# Altium schematic symbol library lib_datalogger.SchLib: 1246 symbols (part 4 of 16) (continued)
## CMP-004-000054-5 (continued)
footprint CC1005-0402 (Chip Capacitor; Body 0.039" L x 0.020" W (1.00mm x 0.50mm))
footprint CC2012-0805 (Chip Capacitor)
pins: 1, 2

## CMP-004-000055-2
designator C?, comment CAP CER 12pF 50V 5% NP0 0402 SMD  Package Quantity: 1  RoHS Compliant: Yes  Manufacturer: Samsung Electro-Mechanics  Case/Package: 0402  Packaging: Tape and Reel  Voltage Rating: 50V  Capacitance: 12pF  Max Operating Temperature: 125°C  Min Operating Temperature: -55°C  Tolerance: 5%
Ceramic capacitor SMD-0402 12pF /50V C0G# J +-5%, Samsung, RoHS; Part#: CL05C120JB5NNNC; eVendor: LCSC; Temperature Coefficient: 300ppm/°C; eVendor#: C26406; Dielectric: C0G; eVendorPrice: 0,0037; ComponentLink1Description: https://datasheet.ciiva.com/25806/cl05c120jb5nnnc-25806484.pdf?src-supplier=Digi-Key; Construction: Flat; Depth: 0.5mm; Material: Ceramic; ComponentLink3Description: https://datasheet.ciiva.com/29198/458703-da-01-en-vs-kondensator-0402-29198421.pdf?src-supplier=Conrad; Case Code (Metric): 1005; Length: 1mm; Series: CL; ComponentLink2Description: https://datasheet.ciiva.com/26838/getdatasheetpartid-658047-26838280.pdf?src-supplier=Verical; Source: mits.SchLib; Width: 0.02inch; Lead Free: Lead Free; Design Item ID: CAP CER 12pF 50V 5% NP0 0402 SMD; ComponentLink2URL: https://datasheet.ciiva.com/26838/getdatasheetpartid-658047-26838280.pdf?src-supplier=Verical; ComponentLink3URL: https://datasheet.ciiva.com/29198/458703-da-01-en-vs-kondensator-0402-29198421.pdf?src-supplier=Conrad; ComponentLink4URL: https://datasheet.ciiva.com/16449/cl05b104kq5nnnc-16449055.pdf?src-supplier=Future+Electronics; RoHS: Yes; Voltage Rating (DC): 50V; Contact Plating: Tin; ComponentLink1URL: https://datasheet.ciiva.com/25806/cl05c120jb5nnnc-25806484.pdf?src-supplier=Digi-Key; Stock 1: 135300; MOQ: 8690; Pricing 1: 100=0,00410, 1000=0,00310, 3000=0,00290, 10000=0,00270, 50000=0,00260, 100000=0,00260, 100=0,00390, 1000=0,00300, 3000=0,00280, 10000=0,00260, 50000=0,00250, 100000=0,00250, 100=0,02040, 1000=0,01580, 3000=0,01450, 10000=0,01380, 50000=0,01310, 100000=0,01310, 100=0,01960, 1000=0,01520, 3000=0,01390, 10000=0,01330, 50000=0,01260, 100000=0,01260, 100=0,00260, 1000=0,00200, 3000=0,00190, 10000=0,00180, 50000=0,00170, 100000=0,00170, 100=0,00230, 1000=0,00170, 3000=0,00160, 10000=0,00150, 50000=0,00150, 100000=0,00150, 100=0,02410, 1000=0,01870, 3000=0,01710, 10000=0,01630, 50000=0,01550, 100000=0,01550, 100=0,34060, 1000=0,26370, 3000=0,24170, 10000=0,23070, 50000=0,21970, 100000=0,21970, 100=0,01280, 1000=0,00990, 3000=0,00910, 10000=0,00870, 50000=0,00830, 100000=0,00830, 100=0,23450, 1000=0,18160, 3000=0,16640, 10000=0,15890, 50000=0,15130, 100000=0,15130, 100=0,02690, 1000=0,02080, 3000=0,01910, 10000=0,01820, 50000=0,01740, 100000=0,01740, 100=0,00420, 1000=0,00320, 3000=0,00300, 10000=0,00280, 50000=0,00270, 100000=0,00270, 100=0,00310, 1000=0,00240, 3000=0,00220, 10000=0,00210, 50000=0,00200, 100000=0,00200 (AUD); Category: Ceramic Capacitors; Case Code (Imperial): 0402; Thickness: 0.022inch; Manufacturer Part Number: CL05C120JB5NNNC; ComponentLink4Description: https://datasheet.ciiva.com/16449/cl05b104kq5nnnc-16449055.pdf?src-supplier=Future+Electronics; Radiation Hardening: No; Mount: Surface Mount; Voltage: 50V; Height: 0.5mm
footprint CC1005-0402 (Chip Capacitor; Body 0.039" L x 0.020" W (1.00mm x 0.50mm))
footprint CC1005-0402 (Chip Capacitor; Body 0.039" L x 0.020" W (1.00mm x 0.50mm))
pins: 1, 2

## CMP-004-000056-2
designator C?, comment CAP CER 18pF 50V 1% NP0 0402 SMD  Manufacturer: Murata Electronics North America
CAP CER 18PF 50V 1% NP0 0402; Part#: GRM1555C1H180FA01D; eVendorPrice: 0,10; MSRP: 0,011; eVendor: Digi-Key; eVendor#: 490-6203-1-ND; Source: mits.SchLib; Design Item ID: CAP CER 18pF 50V 1% NP0 0402 SMD; Datasheet: http://search.murata.co.jp/Ceramy/image/img/A01X/partnumbering_e_01.pdf; MOQ: 5000
footprint CC1005-0402 (Chip Capacitor; Body 0.039" L x 0.020" W (1.00mm x 0.50mm))
footprint CC1005-0402-3 (Chip Capacitor; Body 0.039" L x 0.020" W (1.00mm x 0.50mm))
pins: 1, 2

## CMP-004-000057-2
designator C?, comment CAP CER 1nF 250V 10% X7R 0603 SMD  Packaging: Tape and Reel  Case/Package: 0603  Tolerance: 10%  Min Operating Temperature: -55°C  Capacitance: 1nF  Max Operating Temperature: 125°C  RoHS Compliant: Yes  Voltage Rating: 250V
Cap Ceramic 0.001uF 250V X7R 10% Pad SMD 0603 125°C T/R; Manufacturer Part Number 1: CC0603KRX7RYBB102; Manufacturer 1: Yageo; Thickness: 0.035inch; Width: 0.031inch; ComponentLink1Description: https://datasheet.ciiva.com/16199/cl05b104kq5nnnc-16199064.pdf?src-supplier=Future+Electronics; Length: 0.063inch; Supplier Unit Price 1: *; ComponentLink1URL: https://datasheet.ciiva.com/16199/cl05b104kq5nnnc-16199064.pdf?src-supplier=Future+Electronics; Category: Ceramic Capacitors; Source: mits.SchLib; Design Item ID: CAP CER 1nF 250V 10% X7R 0603 SMD; Mount: Surface Mount
footprint CC1005-0402 (Chip Capacitor; Body 0.039" L x 0.020" W (1.00mm x 0.50mm))
footprint CC1608-0603 (Chip Capacitor; Body 1.6 x 0.8 mm (LxW typ))
pins: 1, 2

## CMP-004-000058-2
designator C?, comment CAP CER 1nF 50V 10% X7R 0603 SMD  Min Operating Temperature: -55°C  Capacitance: 1nF  Manufacturer: Samsung  Packaging: Tape and Reel  Tolerance: 10%  RoHS Compliant: Yes  Voltage Rating: 50V  Package Quantity: 1  Case/Package: 0603  Max Operating Temperature: 125°C
Cap Ceramic 0.001uF 50V X7R 10% Pad SMD 0603 125°C T/R; Manufacturer Part Number: CL10B102KB8NNNC; Case Code (Metric): 1608; Material: Ceramic; ComponentLink1URL: https://datasheet.ciiva.com/25805/cl10b102kb8nnnc-25805137.pdf?src-supplier=Digi-Key; Case Code (Imperial): 0603; Dielectric: X7R; ComponentLink1Description: https://datasheet.ciiva.com/25805/cl10b102kb8nnnc-25805137.pdf?src-supplier=Digi-Key; Voltage Rating (DC): 50V; Category: Ceramic Capacitors; Voltage: 50V; Depth: 0.8mm; Contact Plating: Tin; Source: mits.SchLib; ComponentLink2Description: https://datasheet.ciiva.com/15216/getdatasheetpartid-359690-15216231.pdf?src-supplier=Verical; Thickness: 0.035inch; ComponentLink4URL: https://datasheet.ciiva.com/26310/mlcc-catalogdownload2013-eng-26310326.pdf?src-supplier=Distrelec; ComponentLink4Description: https://datasheet.ciiva.com/26310/mlcc-catalogdownload2013-eng-26310326.pdf?src-supplier=Distrelec; Design Item ID: CAP CER 1nF 50V 10% X7R 0603 SMD; Length: 1.6mm; Construction: Flat; ComponentLink5Description: https://datasheet.ciiva.com/16199/cl05b104kq5nnnc-16199064.pdf?src-supplier=Future+Electronics; ComponentLink2URL: https://datasheet.ciiva.com/15216/getdatasheetpartid-359690-15216231.pdf?src-supplier=Verical; ComponentLink3URL: https://datasheet.ciiva.com/29198/458300-da-01-en-vs-kondensator-0603-29198498.pdf?src-supplier=Conrad; Series: CL; Pricing 1: 50=0,00710, 500=0,00540, 1500=0,00510, 5000=0,00470, 25000=0,00460, 50000=0,00460, 50=0,00680, 500=0,00520, 1500=0,00490, 5000=0,00450, 25000=0,00440, 50000=0,00440, 50=0,03550, 500=0,02690, 1500=0,02560, 5000=0,02370, 25000=0,02300, 50000=0,02300, 50=0,03410, 500=0,02590, 1500=0,02460, 5000=0,02270, 25000=0,02210, 50000=0,02210, 50=0,00460, 500=0,00350, 1500=0,00330, 5000=0,00310, 25000=0,00300, 50000=0,00300, 50=0,00390, 500=0,00300, 1500=0,00280, 5000=0,00260, 25000=0,00250, 50000=0,00250, 50=0,04200, 500=0,03190, 1500=0,03030, 5000=0,02800, 25000=0,02720, 50000=0,02720, 50=0,59330, 500=0,45040, 1500=0,42850, 5000=0,39550, 25000=0,38450, 50000=0,38450, 50=0,02240, 500=0,01700, 1500=0,01620, 5000=0,01490, 25000=0,01450, 50000=0,01450, 50=0,40850, 500=0,31020, 1500=0,29500, 5000=0,27230, 25000=0,26480, 50000=0,26480, 50=0,04690, 500=0,03560, 1500=0,03390, 5000=0,03130, 25000=0,03040, 50000=0,03040, 50=0,00730, 500=0,00550, 1500=0,00530, 5000=0,00490, 25000=0,00470, 50000=0,00470, 50=0,00540, 500=0,00410, 1500=0,00390, 5000=0,00360, 25000=0,00350, 50000=0,00350 (AUD); Height: 0.8mm; Mount: Surface Mount; ComponentLink5URL: https://datasheet.ciiva.com/16199/cl05b104kq5nnnc-16199064.pdf?src-supplier=Future+Electronics; RoHS: Yes; Radiation Hardening: No; Lead Free: Lead Free; Width: 0.031inch; ComponentLink3Description: https://datasheet.ciiva.com/29198/458300-da-01-en-vs-kondensator-0603-29198498.pdf?src-supplier=Conrad; Stock 1: 1234100
footprint CC1005-0402 (Chip Capacitor; Body 0.039" L x 0.020" W (1.00mm x 0.50mm))
footprint CC1608-0603 (Chip Capacitor; Body 1.6 x 0.8 mm (LxW typ))
pins: 1, 2

## CMP-004-000059-2
designator C?, comment CAP CER 1nF 50V 10% X7R 0805 SMD  Case/Package: 0805  Tolerance: 5%  Max Operating Temperature: 125°C  Min Operating Temperature: -55°C  Package Quantity: 1  Lead Pitch: 0.75mm  Packaging: Tape and Reel  Voltage Rating: 50V  Capacitance: 1nF  Manufacturer: KEMET
Cap Ceramic 0.001uF 50V C0G 5% SMD 0805 125C Paper T/R; Manufacturer Part Number: C0805C102J5GACTU; Dissipation Factor: 0.1%; Temperature Coefficient: 30ppm/°C; ComponentLink7URL: https://datasheet.ciiva.com/7842/1776094-7842155.pdf?src-supplier=Element14; ComponentLink2URL: https://datasheet.ciiva.com/5904/1776094-5904675.pdf?src-supplier=Farnell; Stock 1: 125276; ComponentLink9Description: https://datasheet.ciiva.com/14586/70095383-14586728.pdf?src-supplier=Allied+Electronics; Contact Material: Tin; Number of Pins: 2; ComponentLink10Description: https://datasheet.ciiva.com/7842/1776094-7842154.pdf?src-supplier=Element14; ComponentLink5Description: https://datasheet.ciiva.com/7842/f9080b-0402-series-c0g-7842521.pdf?src-supplier=Element14; REACH SVHC: No SVHC; Mount: Surface Mount,PCB; ComponentLink3URL: https://datasheet.ciiva.com/7172/1668701-7172393.pdf?src-supplier=Newark; Contact Plating: Tin,Matte; Lead Free: Lead Free; Termination: SMD/SMT; ComponentLink1URL: https://datasheet.ciiva.com/26923/getdatasheetpartid-772891-26923949.pdf?src-supplier=Verical; ComponentLink8URL: https://datasheet.ciiva.com/18193/getdatasheetpartid-293878-18193318.pdf?src-supplier=Verical; Dielectric: C0G; Length: 2mm; ComponentLink8Description: https://datasheet.ciiva.com/18193/getdatasheetpartid-293878-18193318.pdf?src-supplier=Verical; Design Item ID: CAP CER 1nF 50V 10% X7R 0805 SMD; ComponentLink6Description: https://datasheet.ciiva.com/28672/1789732-28672793.pdf?src-supplier=Element14; Pricing 1: 1=0,13000, 10=0,09500, 100=0,04460, 500=0,03126, 1000=0,02589 (USD); Thickness: 0.035inch; Source: mits.SchLib; ComponentLink1Description: https://datasheet.ciiva.com/26923/getdatasheetpartid-772891-26923949.pdf?src-supplier=Verical; ComponentLink7Description: https://datasheet.ciiva.com/7842/1776094-7842155.pdf?src-supplier=Element14; ComponentLink2Description: https://datasheet.ciiva.com/5904/1776094-5904675.pdf?src-supplier=Farnell; ComponentLink3Description: https://datasheet.ciiva.com/7172/1668701-7172393.pdf?src-supplier=Newark; Width: 1.2mm; Height: 0.78mm; Dielectric Material: Ceramic; RoHS: Yes; ComponentLink4URL: https://datasheet.ciiva.com/7842/kem-c1003-c0g-smd-7842520.pdf?src-supplier=Element14; Voltage: 50V; ComponentLink10URL: https://datasheet.ciiva.com/7842/1776094-7842154.pdf?src-supplier=Element14; Radiation Hardening: No; Case Code (Metric): 2012; Depth: 1.25mm; ComponentLink6URL: https://datasheet.ciiva.com/28672/1789732-28672793.pdf?src-supplier=Element14; Case Code (Imperial): 0805; ComponentLink4Description: https://datasheet.ciiva.com/7842/kem-c1003-c0g-smd-7842520.pdf?src-supplier=Element14; ComponentLink9URL: https://datasheet.ciiva.com/14586/70095383-14586728.pdf?src-supplier=Allied+Electronics; ComponentLink5URL: https://datasheet.ciiva.com/7842/f9080b-0402-series-c0g-7842521.pdf?src-supplier=Element14; Category: Tantalum Capacitors; Voltage Rating (DC): 50V
footprint CC1005-0402 (Chip Capacitor; Body 0.039" L x 0.020" W (1.00mm x 0.50mm))
footprint CC2012-0805 (Chip Capacitor)
pins: 1, 2

## CMP-004-000060-3
designator C?, comment CAP CER 1uF 100V 10% X7R 0805 SMD  Max Operating Temperature: 125°C  Capacitance: 1uF  Voltage Rating: 100V  Min Operating Temperature: -55°C  Case/Package: 0805  Package Quantity: 1  Tolerance: 10%  Packaging: Tape and Reel  Manufacturer: TDK
1 µF, 100 V, 0805 10%, X7S, CGA Series; Manufacturer Part Number: CGA4J3X7S2A105K125AB; Pricing 1: 1=0,46000, 10=0,32200, 100=0,21190, 500=0,15698, 1000=0,13343 (USD); Composition: Ceramic; Thickness: 0.057inch; ComponentLink2Description: https://datasheet.ciiva.com/17487/e413-cga-17487211.pdf?src-supplier=Avnet+Europe; Termination: SMD/SMT; Lead Free: Lead Free; Weight: 0.000194oz; REACH SVHC: No SVHC; Design Item ID: CAP CER 1uF 100V 10% X7R 0805 SMD; Source: mits.SchLib; Radiation Hardening: No; Depth: 1.25mm; Dielectric: X7S; ComponentLink1Description: https://datasheet.ciiva.com/24218/cga4j3x7s2a105k125ab-265950-24218289.pdf?src-supplier=Mouser; ComponentLink1URL: https://datasheet.ciiva.com/24218/cga4j3x7s2a105k125ab-265950-24218289.pdf?src-supplier=Mouser; Mount: Surface Mount; ComponentLink2URL: https://datasheet.ciiva.com/17487/e413-cga-17487211.pdf?src-supplier=Avnet+Europe; Voltage Rating (DC): 100V; Case Code (Imperial): 0805; Length: 2mm; Ratings: AEC-Q200; RoHS: Yes; Height: 1.25mm; Category: Ceramic Capacitors; Width: 0.049inch; Stock 1: 205859; Case Code (Metric): 2012
footprint CC1005-0402 (Chip Capacitor; Body 0.039" L x 0.020" W (1.00mm x 0.50mm))
footprint CC2012-0805 (Chip Capacitor)
pins: 1, 2

## CMP-004-000061-2
designator C?, comment CAP CER 1uF 16V 10% X7R 0603 SMD  Min Operating Temperature: -55°C  RoHS Compliant: Yes  Max Operating Temperature: 85°C  Tolerance: 10%  Case/Package: 0603  Manufacturer: Vishay  Capacitance: 1uF  Packaging: Tape and Reel
Cap Ceramic 1uF 16V X5R 10% SMD 0603 85C Paper T/R; Manufacturer Part Number: VJ0603G105KXJCW1BC; Dielectric Material: Tantalum; Voltage Rating (DC): 16V; ComponentLink1URL: http://components.arrow.com/part/dataview/0323_01411208?src-supplier=Arrow+Europe; Lead Free: Lead Free; Source: mits.SchLib; RoHS: Yes; Category: Ceramic Capacitors; Design Item ID: CAP CER 1uF 16V 10% X7R 0603 SMD; Length: 1.6mm; Stock 1: 116460; Pricing 1: 20=0,04640, 200=0,03600, 600=0,03410, 2000=0,03220, 10000=0,03140, 20000=0,03090, 20=0,04470, 200=0,03460, 600=0,03290, 2000=0,03100, 10000=0,03020, 20000=0,02970, 20=0,23320, 200=0,18070, 600=0,17150, 2000=0,16160, 10000=0,15770, 20000=0,15510, 20=0,22420, 200=0,17370, 600=0,16490, 2000=0,15540, 10000=0,15160, 20000=0,14910, 20=0,03020, 200=0,02340, 600=0,02220, 2000=0,02090, 10000=0,02040, 20000=0,02000, 20=0,02580, 200=0,02000, 600=0,01890, 2000=0,01790, 10000=0,01740, 20000=0,01710, 20=0,27600, 200=0,21380, 600=0,20290, 2000=0,19120, 10000=0,18660, 20000=0,18350, 20=3,90020, 200=3,02130, 600=2,86750, 2000=2,70270, 10000=2,63680, 20000=2,59280, 20=0,14710, 200=0,11400, 600=0,10820, 2000=0,10190, 10000=0,09950, 20000=0,09780, 20=2,68560, 200=2,08040, 600=1,97450, 2000=1,86100, 10000=1,81560, 20000=1,78540, 20=0,30830, 200=0,23880, 600=0,22670, 2000=0,21360, 10000=0,20840, 20000=0,20500, 20=0,04790, 200=0,03710, 600=0,03520, 2000=0,03320, 10000=0,03240, 20000=0,03180, 20=0,03550, 200=0,02750, 600=0,02610, 2000=0,02460, 10000=0,02400, 20000=0,02360 (AUD); Depth: 0.8mm; ComponentLink1Description: http://components.arrow.com/part/dataview/0323_01411208?src-supplier=Arrow+Europe; ComponentLink2URL: http://www.vishay.com/docs/28548/vjw1bcbascomseries.pdf?src-supplier=Digi-Key; Dielectric: X5R; ComponentLink2Description: http://www.vishay.com/docs/28548/vjw1bcbascomseries.pdf?src-supplier=Digi-Key
footprint CC1005-0402 (Chip Capacitor; Body 0.039" L x 0.020" W (1.00mm x 0.50mm))
footprint CC1608-0603 (Chip Capacitor; Body 1.6 x 0.8 mm (LxW typ))
pins: 1, 2

## CMP-004-000062-2
designator C?, comment CAP CER 1uF 50V 10% X7R 0603 SMD  Min Operating Temperature: -55°C  Max Operating Temperature: 85°C  Packaging: Tape and Reel  Tolerance: 10%  Package Quantity: 1  Manufacturer: Samsung  Capacitance: 1uF  Case/Package: 0603  Voltage Rating: 50V
Cap Ceramic 1uF 50V X5R 10% SMD 0603 85C Cardboard T/R; Manufacturer Part Number: CL10A105KB8NNNC; Construction: Flat; Series: CL; ComponentLink1URL: https://datasheet.ciiva.com/24218/cga4j3x7s2a105k125ab-265950-24218289.pdf?src-supplier=Mouser; ComponentLink2Description: https://datasheet.ciiva.com/17487/e413-cga-17487211.pdf?src-supplier=Avnet+Europe; Length: 1.6mm; Mount: Surface Mount; Width: 0.031inch; RoHS: Yes; Thickness: 0.035inch; Pricing 2: 4000=0,01908, 8000=0,01906, 16000=0,05086, 24000=0,01901, 32000=0,01899, 40000=0,05066, 400000=0,01893 (USD); ComponentLink3URL: https://datasheet.ciiva.com/26877/getdatasheetpartid-753736-26877879.pdf?src-supplier=Verical; Source: mits.SchLib; Category: Ceramic Capacitors; ComponentLink3Description: https://datasheet.ciiva.com/26877/getdatasheetpartid-753736-26877879.pdf?src-supplier=Verical; Depth: 0.8mm; Dielectric: X5R; ComponentLink1Description: https://datasheet.ciiva.com/24218/cga4j3x7s2a105k125ab-265950-24218289.pdf?src-supplier=Mouser; Case Code (Imperial): 0603; Termination: Wraparound; Radiation Hardening: No; Contact Plating: Tin; Case Code (Metric): 1608; ComponentLink2URL: https://datasheet.ciiva.com/17487/e413-cga-17487211.pdf?src-supplier=Avnet+Europe; Design Item ID: CAP CER 1uF 50V 10% X7R 0603 SMD
footprint CC1005-0402 (Chip Capacitor; Body 0.039" L x 0.020" W (1.00mm x 0.50mm))
footprint CC1608-0603 (Chip Capacitor; Body 1.6 x 0.8 mm (LxW typ))
pins: 1, 2

## CMP-004-000063-3
designator C?, comment CAP CER 2.2nF 50V 5% X7R 0603 SMD  Capacitance: 2.2nF  Manufacturer: Kemet  RoHS Compliant: Yes  Tolerance: 5%  Min Operating Temperature: -55°C  Packaging: Tape and Reel  Package Quantity: 1  Max Operating Temperature: 125°C  Lead Pitch: 0.7mm  Case/Package: 0603  Voltage Rating: 50V
CAP CER 2200PF 50V 5% X7R 0603; Part#: C0603C222J5RACTU; eVendor: Digi-Key; eVendor#: 399-7879-1-ND; eVendorPrice: 0,10; Dissipation Factor: 2.5%; MSRP: 0,0099; Dielectric Material: Ceramic; Design Item ID: CAP CER 2.2nF 50V 5% X7R 0603 SMD; Radiation Hardening: No; Voltage Rating (DC): 50V; Case Code (Imperial): 0603; Construction: Flat; Datasheet: http://www.kemet.com/datasheets&C0603C222J5RACTU; Series: C; Voltage: 50V; Width: 0.031inch; Depth: 0.8mm; MOQ: 1000; Termination: SMD/SMT; REACH SVHC: No SVHC; Number of Pins: 2; Source: mits.SchLib; Dielectric: X7R; Mount: Surface Mount,PCB; Thickness: 0.034inch; Case Code (Metric): 1608; Height: 0.8mm; Length: 1.6mm
footprint CC1005-0402 (Chip Capacitor; Body 0.039" L x 0.020" W (1.00mm x 0.50mm))
footprint CC1608-0603 (Chip Capacitor; Body 1.6 x 0.8 mm (LxW typ))
pins: 1, 2

## CMP-004-000064-2
designator C?, comment CAP CER 2.2uF 100V X7R 1210 SMD  Packaging: Cut Tape (CT)  Manufacturer: Murata Electronics North America  Tolerance: ±10%  Capacitance: 2.2µF
CAP CER 2.2UF 100V X7R 1210; Manufacturer Part Number: GRM32ER72A225KA35L; Features: -; Category: Capacitors; Package / Case: 1210 (3225 Metric); Mounting Type: Surface Mount, MLCC; Lead Style: -; ComponentLink1URL: http://www.murata.com/~/media/webrenewal/support/library/catalog/products/capacitor/mlcc/c02e.pdf; Ratings: -; Lead Spacing: -; Source: mits.SchLib; ComponentLink1Description: http://www.murata.com/~/media/webrenewal/support/library/catalog/products/capacitor/mlcc/c02e.pdf; Voltage - Rated: 100V; Size / Dimension: 0.126" L x 0.098" W (3.20mm x 2.50mm); Stock 1: 228481; Operating Temperature: -55°C ~ 125°C; Pricing 1: 1=0.7, 10=0.67, 50=0.4, 100=0.325, 250=0.27, 500=0.245 (USD); Thickness (Max): 0.106" (2.70mm); Height - Seated (Max): -; Design Item ID: CAP CER 2.2uF 100V X7R 1210 SMD; Temperature Coefficient: X7R; Applications: General Purpose; RoHS: RoHS Compliant
footprint CC1005-0402 (Chip Capacitor; Body 0.039" L x 0.020" W (1.00mm x 0.50mm))
footprint CC3225-1210 (Chip Capacitor; Body 1.6 x 0.8 mm (LxW typ))
pins: 1, 2

## CMP-004-000065-2
designator C?, comment CAP CER 2.2uF 50V 10% X5R 0805 SMD  Voltage Rating: 50V  RoHS Compliant: Yes  Package Quantity: 1  Capacitance: 2.2uF  Manufacturer: Samsung  Packaging: Tape and Reel  Tolerance: 10%  Min Operating Temperature: -55°C  Max Operating Temperature: 85°C  Case/Package: 0805
CAP CER 2.2UF 50V X5R 0805; Manufacturer Part Number: CL21A225KB9LNNC; Stock 1: 10649; Dielectric: X5R; Width: 0.049inch; Lead Free: Lead Free; Case Code (Imperial): 0805; Category: Ceramic Capacitors; Case Code (Metric): 2012; Depth: 1.25mm; ComponentLink1Description: https://datasheet.ciiva.com/25796/cl21a225kb9lnnc-25796770.pdf?src-supplier=Digi-Key; Length: 0.079inch; Mount: Surface Mount; RoHS: Yes; Series: CL; Pricing 1: 1=0,31000, 10=0,21400, 50=0,14240, 100=0,12100, 500=0,08542, 1000=0,07474 (USD); Design Item ID: CAP CER 2.2uF 50V 10% X5R 0805 SMD; Source: mits.SchLib; ComponentLink1URL: https://datasheet.ciiva.com/25796/cl21a225kb9lnnc-25796770.pdf?src-supplier=Digi-Key; Thickness: 0.039inch
footprint CC1005-0402 (Chip Capacitor; Body 0.039" L x 0.020" W (1.00mm x 0.50mm))
footprint CC2012-0805 (Chip Capacitor)
pins: 1, 2

## CMP-004-000066-2
designator C?, comment CAP CER 22nF 50V C0G 1206 SMD_1  Manufacturer: TDK Corporation  Packaging: Cut Tape (CT)  Capacitance: 0.022µF  Tolerance: ±5%
CAP CER 0.022UF 50V C0G 1206; Manufacturer Part Number: C3216C0G1H223J060AA; Temperature Coefficient: C0G, NP0; ComponentLink1URL: https://product.tdk.com/info/en/catalog/datasheets/mlcc_commercial_general_en.pdf; Applications: General Purpose; Lead Style: -; Operating Temperature: -55°C ~ 125°C; Size / Dimension: 0.126" L x 0.063" W (3.20mm x 1.60mm); ComponentLink1Description: https://product.tdk.com/info/en/catalog/datasheets/mlcc_commercial_general_en.pdf; RoHS: RoHS Compliant; Features: Low ESL; Failure Rate: -; Part Status: Active; Ratings: -; Category: Capacitors; Thickness (Max): 0.028" (0.70mm); Pricing 1: 1=0.48, 10=0.417, 100=0.2086, 250=0.16684, 500=0.15196, 1000=0.13706 (USD); Mounting Type: Surface Mount, MLCC; Stock 1: 9101; Height - Seated (Max): -; Package / Case: 1206 (3216 Metric); Source: mits.SchLib; Voltage - Rated: 50V; Design Item ID: CAP CER 22nF 50V C0G 1206 SMD_1; Lead Spacing: -
footprint CC1005-0402 (Chip Capacitor; Body 0.039" L x 0.020" W (1.00mm x 0.50mm))
footprint CC3216-1206 (Chip Capacitor; Body 3.2 x 1.6 mm (LxW typ))
pins: 1, 2

## CMP-004-000067-2
designator C?, comment CAP CER 22pF 50V 5% NP0 0402 SMD  Manufacturer: Murata  Min Operating Temperature: -55°C  RoHS Compliant: Yes  Package Quantity: 10000  Packaging: Tape and Reel  Voltage Rating: 50V  Tolerance: 5%  Max Operating Temperature: 125°C  Capacitance: 22pF  Case/Package: 0402
Cap Ceramic 22pF 50V C0G 5% Pad SMD 0402 125°C T/R; Manufacturer Part Number: GRM1555C1H220JA01D; Lead Free: Lead Free; ComponentLink1URL: https://datasheet.ciiva.com/6277/product-6277809.pdf?src-supplier=Digi-Key; Pricing 1: 100=0,00380, 1000=0,00290, 3000=0,00270, 10000=0,00250, 50000=0,00250, 100000=0,00240, 100=0,00360, 1000=0,00280, 3000=0,00260, 10000=0,00240, 50000=0,00240, 100000=0,00230, 100=0,01900, 1000=0,01440, 3000=0,01380, 10000=0,01240, 50000=0,01240, 100000=0,01180, 100=0,01810, 1000=0,01370, 3000=0,01310, 10000=0,01190, 50000=0,01190, 100000=0,01120, 100=0,00240, 1000=0,00180, 3000=0,00180, 10000=0,00160, 50000=0,00160, 100000=0,00150, 100=0,00210, 1000=0,00160, 3000=0,00150, 10000=0,00140, 50000=0,00140, 100000=0,00130, 100=0,02260, 1000=0,01710, 3000=0,01630, 10000=0,01480, 50000=0,01480, 100000=0,01400, 100=0,31690, 1000=0,24040, 3000=0,22950, 10000=0,20760, 50000=0,20760, 100000=0,19670, 100=0,01200, 1000=0,00910, 3000=0,00870, 10000=0,00790, 50000=0,00790, 100000=0,00740, 100=0,22310, 1000=0,16930, 3000=0,16160, 10000=0,14620, 50000=0,14620, 100000=0,13850, 100=0,02480, 1000=0,01880, 3000=0,01790, 10000=0,01620, 50000=0,01620, 100000=0,01540, 100=0,00390, 1000=0,00290, 3000=0,00280, 10000=0,00250, 50000=0,00250, 100000=0,00240, 100=0,00290, 1000=0,00220, 3000=0,00210, 10000=0,00190, 50000=0,00190, 100000=0,00180 (AUD); Width: 0.02inch; Source: mits.SchLib; Case Code (Metric): 1005; Length: 1mm; Termination: SMD/SMT; Stock 1: 183800; Depth: 0.5mm; Construction: Flat; Series: GRM; Dielectric: C0G; Material: Ceramic; Radiation Hardening: No; Category: Ceramic Capacitors; ComponentLink5Description: https://datasheet.ciiva.com/7828/1666664-7828846.pdf?src-supplier=Element14; Design Item ID: CAP CER 22pF 50V 5% NP0 0402 SMD; ComponentLink3Description: https://datasheet.ciiva.com/29200/453714-da-01-en-vs-kondensator-0402-29200051.pdf?src-supplier=Conrad; ComponentLink4URL: https://datasheet.ciiva.com/16440/l0005e-16440552.pdf?src-supplier=Future+Electronics; ComponentLink5URL: https://datasheet.ciiva.com/7828/1666664-7828846.pdf?src-supplier=Element14; REACH SVHC: No SVHC; Thickness: 0.022inch; ComponentLink2Description: https://datasheet.ciiva.com/18184/getdatasheetpartid-316063-18184267.pdf?src-supplier=Verical; ComponentLink4Description: https://datasheet.ciiva.com/16440/l0005e-16440552.pdf?src-supplier=Future+Electronics; Mount: Surface Mount; Voltage Rating (DC): 50V; ComponentLink2URL: https://datasheet.ciiva.com/18184/getdatasheetpartid-316063-18184267.pdf?src-supplier=Verical; ComponentLink1Description: https://datasheet.ciiva.com/6277/product-6277809.pdf?src-supplier=Digi-Key; ComponentLink3URL: https://datasheet.ciiva.com/29200/453714-da-01-en-vs-kondensator-0402-29200051.pdf?src-supplier=Conrad; Case Code (Imperial): 0402; RoHS: Yes; Height: 0.5mm; Voltage: 50V
footprint CC1005-0402 (Chip Capacitor; Body 0.039" L x 0.020" W (1.00mm x 0.50mm))
footprint CC2012-0805 (Chip Capacitor)
pins: 1, 2

## CMP-004-000068-2
designator C?, comment CAP CER 22pF 50V 5% NP0 0805 SMD  Tolerance: ±5%  Manufacturer: KEMET  Capacitance: 22pF  Packaging: Cut Tape (CT)
CAP CER 22PF 50V NP0 0805; Manufacturer Part Number: C0805C220J5GACTU; Temperature Coefficient: C0G, NP0; Features: Low ESL; Source: mits.SchLib; Manufacturer Parn Number 2: FN21N220J500PAG; Voltage - Rated: 50V; Thickness (Max): 0.035" (0.88mm); Design Item ID: CAP CER 22pF 50V 5% NP0 0805 SMD; Lead Style: -; RoHS: RoHS Compliant; Stock 1: 493983; Package / Case: 0805 (2012 Metric); Applications: General Purpose; ComponentLink1Description: http://www.kemet.com/docfinder?Partnumber=C0805C220J5GACTU; Manufacturer 2: PSA(Prosperity Dielectrics); Height - Seated (Max): -; Lead Spacing: -; Size / Dimension: 0.079" L x 0.049" W (2.00mm x 1.25mm); Ratings: -; Operating Temperature: -55°C ~ 125°C; Failure Rate: -; Part Status: Active; ComponentLink1URL: http://www.kemet.com/docfinder?Partnumber=C0805C220J5GACTU; Pricing 1: 1=0.1, 10=0.05, 25=0.036, 50=0.0272, 100=0.0221, 250=0.01852, 500=0.01582, 1000=0.01243 (USD); Supplier Unit Price 2: 0.0047; Category: Capacitors; Mounting Type: Surface Mount, MLCC
footprint CC1005-0402 (Chip Capacitor; Body 0.039" L x 0.020" W (1.00mm x 0.50mm))
footprint CC2012-0805 (Chip Capacitor)
pins: 1, 2

## CMP-004-000069-1
designator RT?, comment CAP CER 22uF 10V 20% 0603 SMD_1  Manufacturer: Samsung  RoHS Compliant: Yes  Case/Package: 0603  Tolerance: 20%  Voltage Rating: 10V  Max Operating Temperature: 85°C  Packaging: Tape and Reel  Capacitance: 22uF  Min Operating Temperature: -55°C
Cap Ceramic 22uF 10V X5R 20% SMD 0603 85°C Embossed T/R; Manufacturer Part Number: CL10A226MP8NUNE; Length: 1.6mm; RoHS: Yes; Lead Free: Lead Free; Depth: 0.8mm; Width: 0.031inch; ComponentLink2Description: https://datasheet.ciiva.com/26838/getdatasheetpartid-746477-26838370.pdf?src-supplier=Verical; Thickness: 0.035inch; ComponentLink2URL: https://datasheet.ciiva.com/26838/getdatasheetpartid-746477-26838370.pdf?src-supplier=Verical; Pricing 1: 20=0,04000, 200=0,03050, 600=0,02880, 2000=0,02700, 10000=0,02620, 20000=0,02590, 20=0,03860, 200=0,02940, 600=0,02770, 2000=0,02600, 10000=0,02520, 20000=0,02500, 20=0,20020, 200=0,15240, 600=0,14390, 2000=0,13480, 10000=0,13080, 20000=0,12950, 20=0,19300, 200=0,14690, 600=0,13870, 2000=0,12990, 10000=0,12610, 20000=0,12490, 20=0,02590, 200=0,01970, 600=0,01860, 2000=0,01740, 10000=0,01690, 20000=0,01670, 20=0,02220, 200=0,01690, 600=0,01600, 2000=0,01490, 10000=0,01450, 20000=0,01440, 20=0,23770, 200=0,18100, 600=0,17090, 2000=0,16000, 10000=0,15540, 20000=0,15380, 20=3,35420, 200=2,55400, 600=2,41150, 2000=2,25800, 10000=2,19230, 20000=2,17040, 20=0,12690, 200=0,09660, 600=0,09120, 2000=0,08540, 10000=0,08290, 20000=0,08210, 20=2,32600, 200=1,77110, 600=1,67230, 2000=1,56590, 10000=1,52030, 20000=1,50510, 20=0,26440, 200=0,20130, 600=0,19010, 2000=0,17800, 10000=0,17280, 20000=0,17110, 20=0,04120, 200=0,03140, 600=0,02960, 2000=0,02770, 10000=0,02690, 20000=0,02660, 20=0,03060, 200=0,02330, 600=0,02200, 2000=0,02060, 10000=0,02000, 20000=0,01980 (AUD); Dielectric: X5R; Radiation Hardening: No; Source: mits.SchLib; ComponentLink1Description: https://datasheet.ciiva.com/25711/cl10a226mp8nune-25711532.pdf?src-supplier=Digi-Key; Series: CL; Category: Ceramic Capacitors; Stock 1: 377320; Case Code (Metric): 1608; Height: 0.8mm; Case Code (Imperial): 0603; Mount: Surface Mount; Design Item ID: CAP CER 22uF 10V 20% 0603 SMD_1; Construction: Flat; ComponentLink1URL: https://datasheet.ciiva.com/25711/cl10a226mp8nune-25711532.pdf?src-supplier=Digi-Key; Contact Plating: Tin
footprint PTC_TH (Jumper Wire; 2 Leads)
footprint CR1608-0603 (Chip Resistor; Body 1.6 x 0.8 mm (LxW typ))
pins: 1, 2
text: t°

## CMP-004-000070-2
designator C?, comment CAP CER 2700pF 50V 10% X7R 0805 SMD  Capacitance: 2700pF  Packaging: Cut Tape (CT)  Tolerance: ±10%  Manufacturer: Yageo
CAP CER 2700PF 50V X7R 0805; Manufacturer Part Number: CC0805KRX7R9BB272; Height - Seated (Max): -; Temperature Coefficient: X7R; ComponentLink1URL: http://www.yageo.com/documents/recent/UPY-GPHC_X7R_6.3V-to-50V_16.pdf; Category: Capacitors; Applications: General Purpose; Mounting Type: Surface Mount, MLCC; ComponentLink1Description: http://www.yageo.com/documents/recent/UPY-GPHC_X7R_6.3V-to-50V_16.pdf; Design Item ID: CAP CER 2700pF 50V 10% X7R 0805 SMD; Source: mits.SchLib; Failure Rate: -; Lead Style: -; Stock 1: 144157; RoHS: RoHS Compliant; Thickness (Max): 0.024" (0.60mm); Ratings: -; Size / Dimension: 0.079" L x 0.049" W (2.00mm x 1.25mm); Package / Case: 0805 (2012 Metric); Part Status: Active; Features: -; Voltage - Rated: 50V; Operating Temperature: -55°C ~ 125°C; Lead Spacing: -; Pricing 1: 1=0.1, 10=0.055, 25=0.0404, 50=0.0302, 100=0.0247, 250=0.02068, 500=0.01764, 1000=0.01386 (USD)
footprint CC1005-0402 (Chip Capacitor; Body 0.039" L x 0.020" W (1.00mm x 0.50mm))
footprint CC2012-0805 (Chip Capacitor)
pins: 1, 2

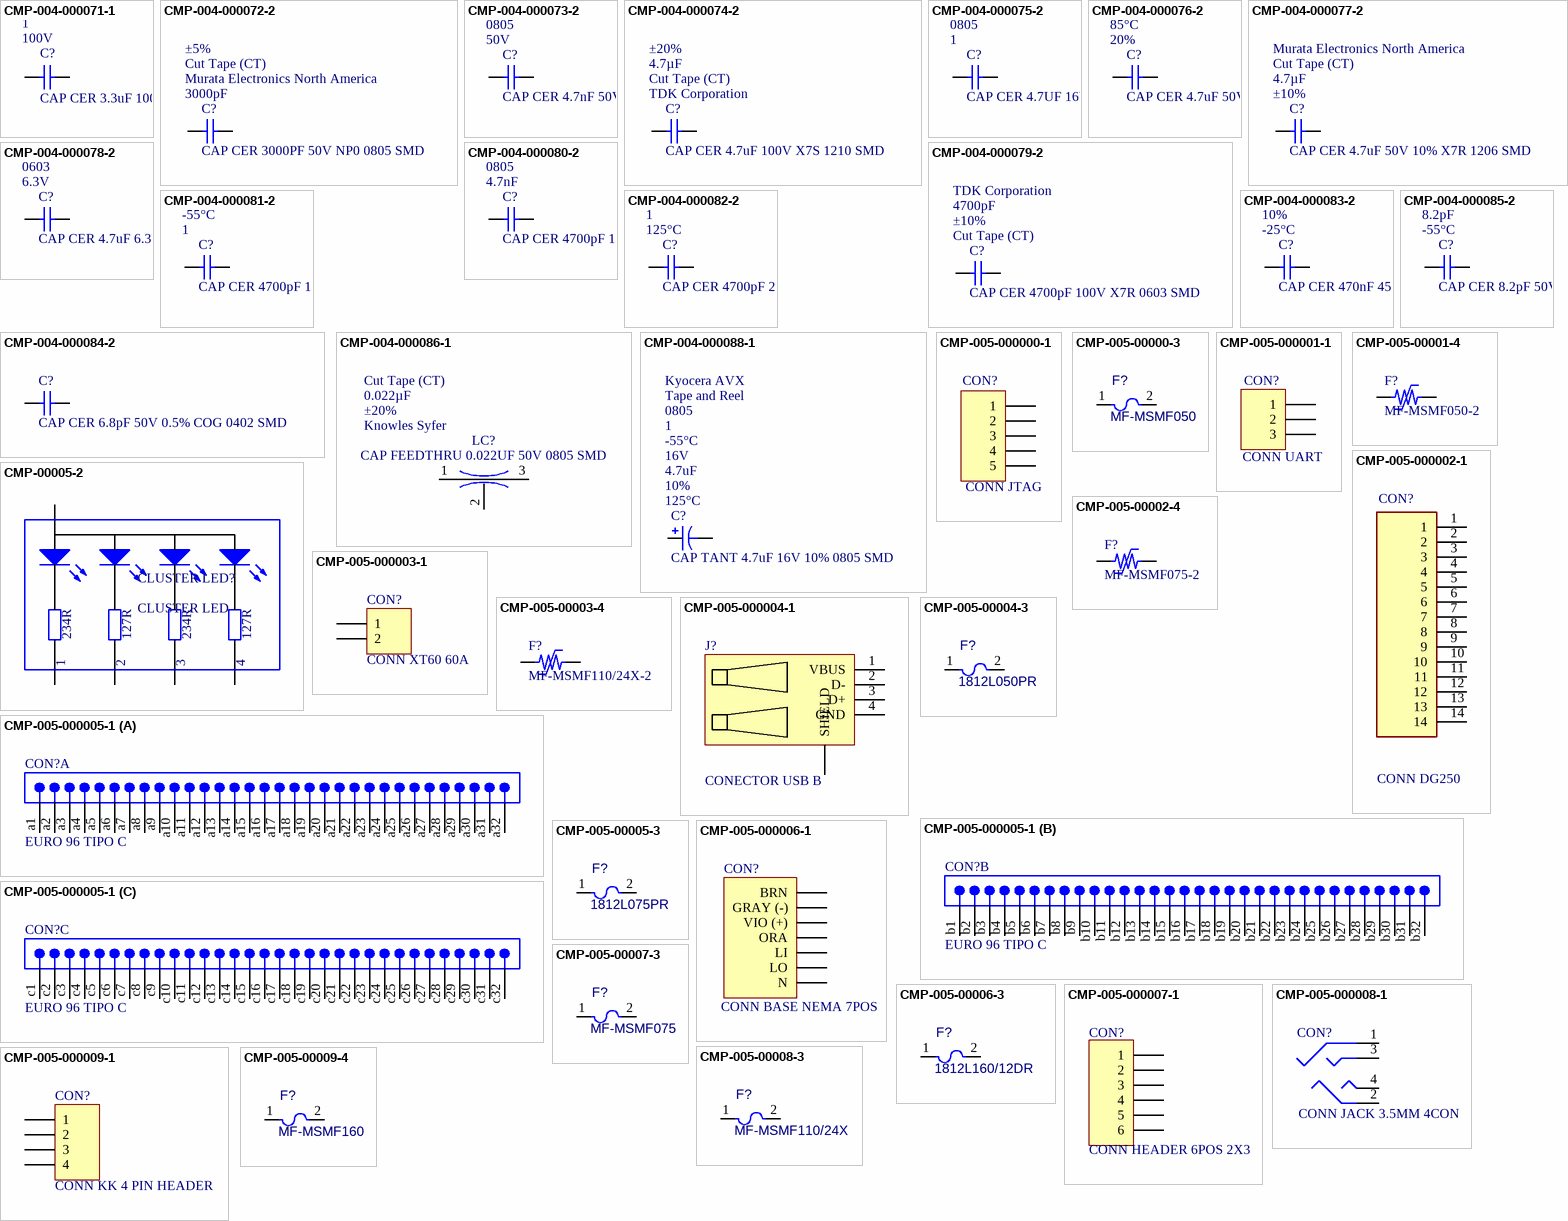
[diagram p10: symbols CMP-004-000071-1 to CMP-005-00009-4]

## CMP-004-000071-1
designator C?, comment CAP CER 3.3uF 100V X7R 1210 SMD  Voltage Rating: 100V  Package Quantity: 1  Case/Package: 1210  Min Operating Temperature: -55°C  Tolerance: 20%  Max Operating Temperature: 125°C  Packaging: Tape and Reel  Manufacturer: TDK  Capacitance: 3.3uF
CAP CER 3.3UF 100V X7S 1210; Manufacturer Part Number: C3225X7S2A335M200AB; Voltage Rating (DC): 100V; Number of Pins: 2; ComponentLink1URL: http://www.murata.com/~/media/webrenewal/support/library/catalog/products/capacitor/mlcc/c02e.pdf; ComponentLink1Description: http://www.murata.com/~/media/webrenewal/support/library/catalog/products/capacitor/mlcc/c02e.pdf; Composition: Ceramic; Width: 0.098inch; ComponentLink5Description: http://www.farnell.com/datasheets/1913358.pdf?src-supplier=Element14; ComponentLink5URL: http://www.farnell.com/datasheets/1913358.pdf?src-supplier=Element14; ComponentLink2URL: http://www.farnell.com/datasheets/1913358.pdf?src-supplier=Farnell; Source: mits.SchLib; ComponentLink7URL: https://product.tdk.com/info/en/catalog/spec/mlccspec_commercial_general_midvoltage_en.pdf?src-supplier=Digi-Key; ComponentLink4Description: http://components.arrow.com/part/dataview/57434618S459059N1165?src-supplier=Arrow; ComponentLink3Description: http://components.arrow.com/part/dataview/0323_06885975?src-supplier=Arrow+Europe; REACH SVHC: No SVHC; Pricing 1: 1=0,88000, 10=0,67100, 100=0,48030, 500=0,37184 (USD); Termination: SMD/SMT; ComponentLink3URL: http://components.arrow.com/part/dataview/0323_06885975?src-supplier=Arrow+Europe; Mount: Surface Mount; Weight: 0.000564oz; Case Code (Imperial): 1210; Length: 3.2mm; Stock 1: 6999; Category: Ceramic Capacitors; Thickness: 0.087inch; Lead Free: Lead Free; ComponentLink6Description: https://product.tdk.com/info/en/documents/chara_sheet/C3225X7S2A335M200AB.pdf?src-supplier=Digi-Key; ComponentLink8Description: http://www.farnell.com/datasheets/1913358.pdf?src-supplier=Newark; Case Code (Metric): 3225; Dielectric: X7S; ComponentLink7Description: https://product.tdk.com/info/en/catalog/spec/mlccspec_commercial_general_midvoltage_en.pdf?src-supplier=Digi-Key; RoHS: Yes; ComponentLink4URL: http://components.arrow.com/part/dataview/57434618S459059N1165?src-supplier=Arrow; ComponentLink2Description: http://www.farnell.com/datasheets/1913358.pdf?src-supplier=Farnell; ComponentLink6URL: https://product.tdk.com/info/en/documents/chara_sheet/C3225X7S2A335M200AB.pdf?src-supplier=Digi-Key; Design Item ID: CAP CER 3.3uF 100V X7R 1210 SMD; ComponentLink8URL: http://www.farnell.com/datasheets/1913358.pdf?src-supplier=Newark; Depth: 2.5mm
footprint CC3225-1210 (Chip Capacitor; Body 1.6 x 0.8 mm (LxW typ))
footprint CC3225-1210 (Chip Capacitor; Body 1.6 x 0.8 mm (LxW typ))
pins: 1, 2
1 alternate drawing of the same symbol

## CMP-004-000072-2
designator C?, comment CAP CER 3000PF 50V NP0 0805 SMD  Capacitance: 3000pF  Manufacturer: Murata Electronics North America  Packaging: Cut Tape (CT)  Tolerance: ±5%